# Altium footprint library Cty1.PcbLib: 870 footprints (part 6 of 55)
Each footprint in its own frame and in the unit in brackets; x right, y up, seen from the top. Pads: shape width x height; smd on the part's side, far side on the other; paste and mask are expansions set on the pad; w line width, h text height; cw(c..) or ccw(c..) is an arc to the next point about the centre after c.
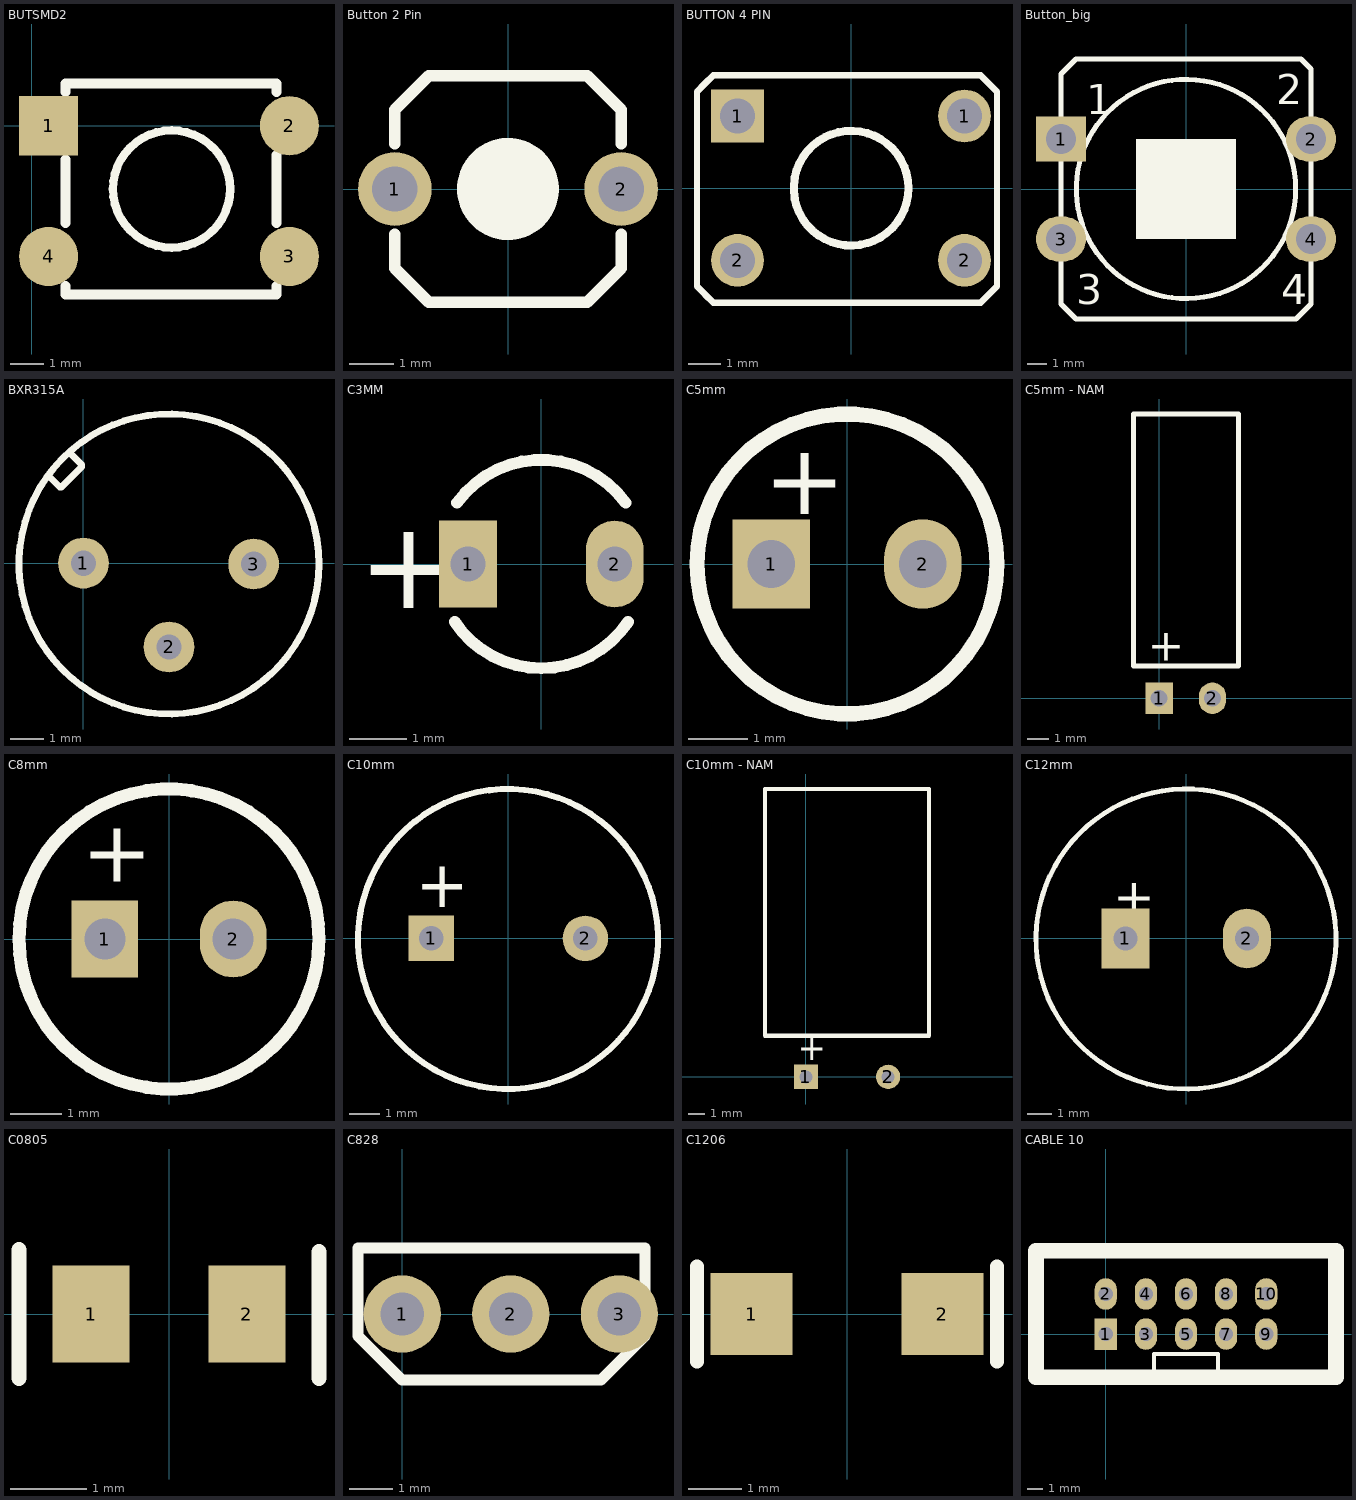
[diagram p5: the footprints below, top view; thin cyan lines are the x and y axes]

## BUTSMD2 [mil]
pads (4):
  rect 70x70 smd: 1(19.68,0)
  round 70 smd: 2(305.31,0) 3(305.31,-155) 4(19.68,-155)
Top Overlay:
  circle w10: c165.54,-75 r69.46
  lines w12: 40,-190 40,-200 290,-200 290,-190 ; 40,-115 40,-40 ; 40,40 40,50 290,50 290,40 ; 290,-115 290,-35

## Button 2 Pin [mil] "Button 200mil 2 Pin"
pads (2):
  round 65 hole 40: 1(-100,0) 2(100,0)
Top Overlay:
  circle w50: c0,0 r20
  lines w10: -100,-40 -100,-70 -70,-100 70,-100 100,-70 100,-40 ; -100,40 -100,70 -70,100 70,100 100,70 100,40

## BUTTON 4 PIN [mil] "BUTTON SMORE 280mil x 178mil"
height 100
pads (4):
  rect 65x65 hole 43.31: 1(-140,89)
  round 65 hole 43.31: 1(140,89) 2(-140,-89) 2(140,-89)
Top Overlay:
  circle w10: c0,0 r70.71
  lines w8: -180,-131 -170,-141 ; -170,-141 -190,-121 -190,119 -180,129 -170,139 -160,139 160,139 180,119 180,-121 160,-141 -170,-141

## Button_big [mil] "Nut an to"
pads (4):
  rect 100x90 hole 60: 1(-250,100)
  oval 100x90 hole 60: 2(250,100) 3(-250,-100) 4(250,-100)
Top Overlay:
  circle w10: c0,0 r219.32
  rectangle: -100,-100 100,100
  lines w10: -250,-140 -250,-230 -220,-260 220,-260 250,-230 250,-140 ; -250,-60 -250,60 ; -250,140 -250,230 -220,260 230,260 250,240 250,140 ; 250,-60 250,60
  text "1" at -200,150 h60
  text "2" at 180,170 h60
  text "3" at -220,-230 h60
  text "4" at 190,-230 h60

## BXR315A [mil] "Xtal for RF"
pads (3):
  round 60 hole 30: 1(0,0) 2(101,-99) 3(201,-1)
Top Overlay:
  circle w8: c101,-1 r177.17
  lines w8: -41,103 -28,90 -26,90 -2,114 -2,116 -15,129

## C3MM [mm]
pads (2):
  rect 1x1.5 hole 0.6: 1(-1.27,0)
  oval 1x1.5 hole 0.6: 2(1.27,0)
Top Overlay:
  lines w0.203: -1.502,-1.001 ccw(c0,0) 1.502,-1.001 ; -1.46,1.062 cw(c0,0) 1.46,1.062
  text "+" at -3.175,-0.762 h1.52
3D body "User Library-Capacitor Radial Electrolitic-150-400x700.step": height 7.01, standoff -2.7, extent -2,-2.025 1.993,1.975

## C5mm [mm]
pads (2):
  rect 1.3x1.5 hole 0.8: 1(-1.27,0)
  oval 1.3x1.5 hole 0.8: 2(1.27,0)
Top Overlay:
  circle w0.254: c0,0 r2.515
  text "+" at -1.397,0.838 h1.2
3D body "User Library-Capacitor Radial Electrolitic 200 - 500x1100.step": height 11.01, standoff -2.7, extent -2.5,-2.5 2.489,2.5

## C5mm - NAM [mm]
pads (2):
  rect 1.3x1.5 hole 0.8: 1(0,0)
  oval 1.3x1.5 hole 0.8: 2(2.54,0)
Top Overlay:
  lines w0.254: -1.219,1.537 3.781,1.537 3.781,13.537 -1.219,13.537 -1.219,1.537
  text "+" at -0.533,1.791 h1.52

## C8mm [mm]
pads (2):
  rect 1.3x1.5 hole 0.8: 1(-1.25,0)
  oval 1.3x1.5 hole 0.8: 2(1.25,0)
Top Overlay:
  circle w0.254: c0,0 r2.921
  text "+" at -1.702,1.118 h1.2
3D body "User Library-Capacitor Radial Electrolitic 250-630x1150.step": height 11.51, standoff -2.7, extent -3.15,-3.15 3.133,3.15

## C10mm [mm]
pads (2):
  rect 1.5x1.5 hole 0.8: 1(-2.54,0)
  round 1.5 hole 0.8: 2(2.54,0)
Top Overlay:
  lines w0.203: 3.591,3.365 ccw(c-0.008,-0.022) 3.623,3.33
  text "+" at -3.048,1.016 h1.52
3D body "User Library-Capacitor Radial Electrolitic 500-1000x2000.step": height 20.01, standoff -2.7, extent -5,-5 4.967,5

## C10mm - NAM [mm]
pads (2):
  rect 1.5x1.5 hole 0.8: 1(0,0)
  round 1.5 hole 0.8: 2(5.08,0)
Top Overlay:
  lines w0.254: -2.527,2.54 7.607,2.54 7.607,17.793 -2.527,17.793 -2.527,2.54
  text "+" at -0.508,1.016 h1.52

## C12mm [mm]
pads (2):
  rect 2x2.5 hole 1: 1(-2.54,0)
  oval 2x2.5 hole 1: 2(2.54,0)
Top Overlay:
  lines w0.203: 4.556,4.273 ccw(c-0.008,-0.022) 4.597,4.228
  text "+" at -3.048,1.016 h1.52

## C0805 [mil] "Chip Resistor; Body 2.0 x 1.3 mm (LxW typ)"
height 100
pads (2):
  rect 39.37x50 smd: 1(-40,0) 2(40,0)
Top Overlay:
  lines w7.87: -77,-33 -77,33 ; 77,-33 77,32
3D body "User Library-0805 SMD Capacitor.step": height 30.79, standoff 0, extent -39.36,-24.6 39.38,24.61

## C828 [mil]
pads (3):
  round 70 hole 39.37 unplated: 1(0,0) 2(98.43,0) 3(196.85,0)
Top Overlay:
  lines w10: -40,-20 -40,60 180,60 220,60 220,-20 180,-60 140,-60 0,-60 -40,-20

## C1206 [mil]
pads (2):
  rect 60x60 smd: 1(-70,0) 2(70,0)
Top Overlay:
  lines w10: -110,-35 -110,35 ; 110,-35 110,35
3D body: height 40, standoff 0, extent -35,-35 35,35
3D body "User Library-1206 SMD Capacitor.step": height 39.45, standoff 0, extent -62.99,-31.49 63,31.5

## CABLE 10 [mm] "Connector; Header; 5x2 Position"
pads (10):
  rect 1.4x2 hole 0.9: 1(0,0)
  oval 1.4x2 hole 0.9: 2(0,2.54) 3(2.54,0) 4(2.54,2.54) 5(5.08,0) 6(5.08,2.54) 7(7.62,0) 8(7.62,2.54) 9(10.16,0) 10(10.16,2.54)
Top Overlay:
  lines w0.254: 3.048,-2.286 3.048,-1.27 6.858,-1.27 7.112,-1.27 7.112,-2.286
  lines w1: -4.42,-2.73 14.58,-2.73 14.58,5.27 -4.42,5.27 -4.42,-2.73
3D body "User Library-Tyco - 5103308-1 (Shrouded Header 2_54mm 10 Pin).step": height 9.86, standoff -3.05, extent -5.08,-3.302 15.24,5.842